# Altium schematic symbol library con-molex.SCHLIB: 368 symbols (part 6 of 6) (continued)
## C-GRID-20-70543 (continued)
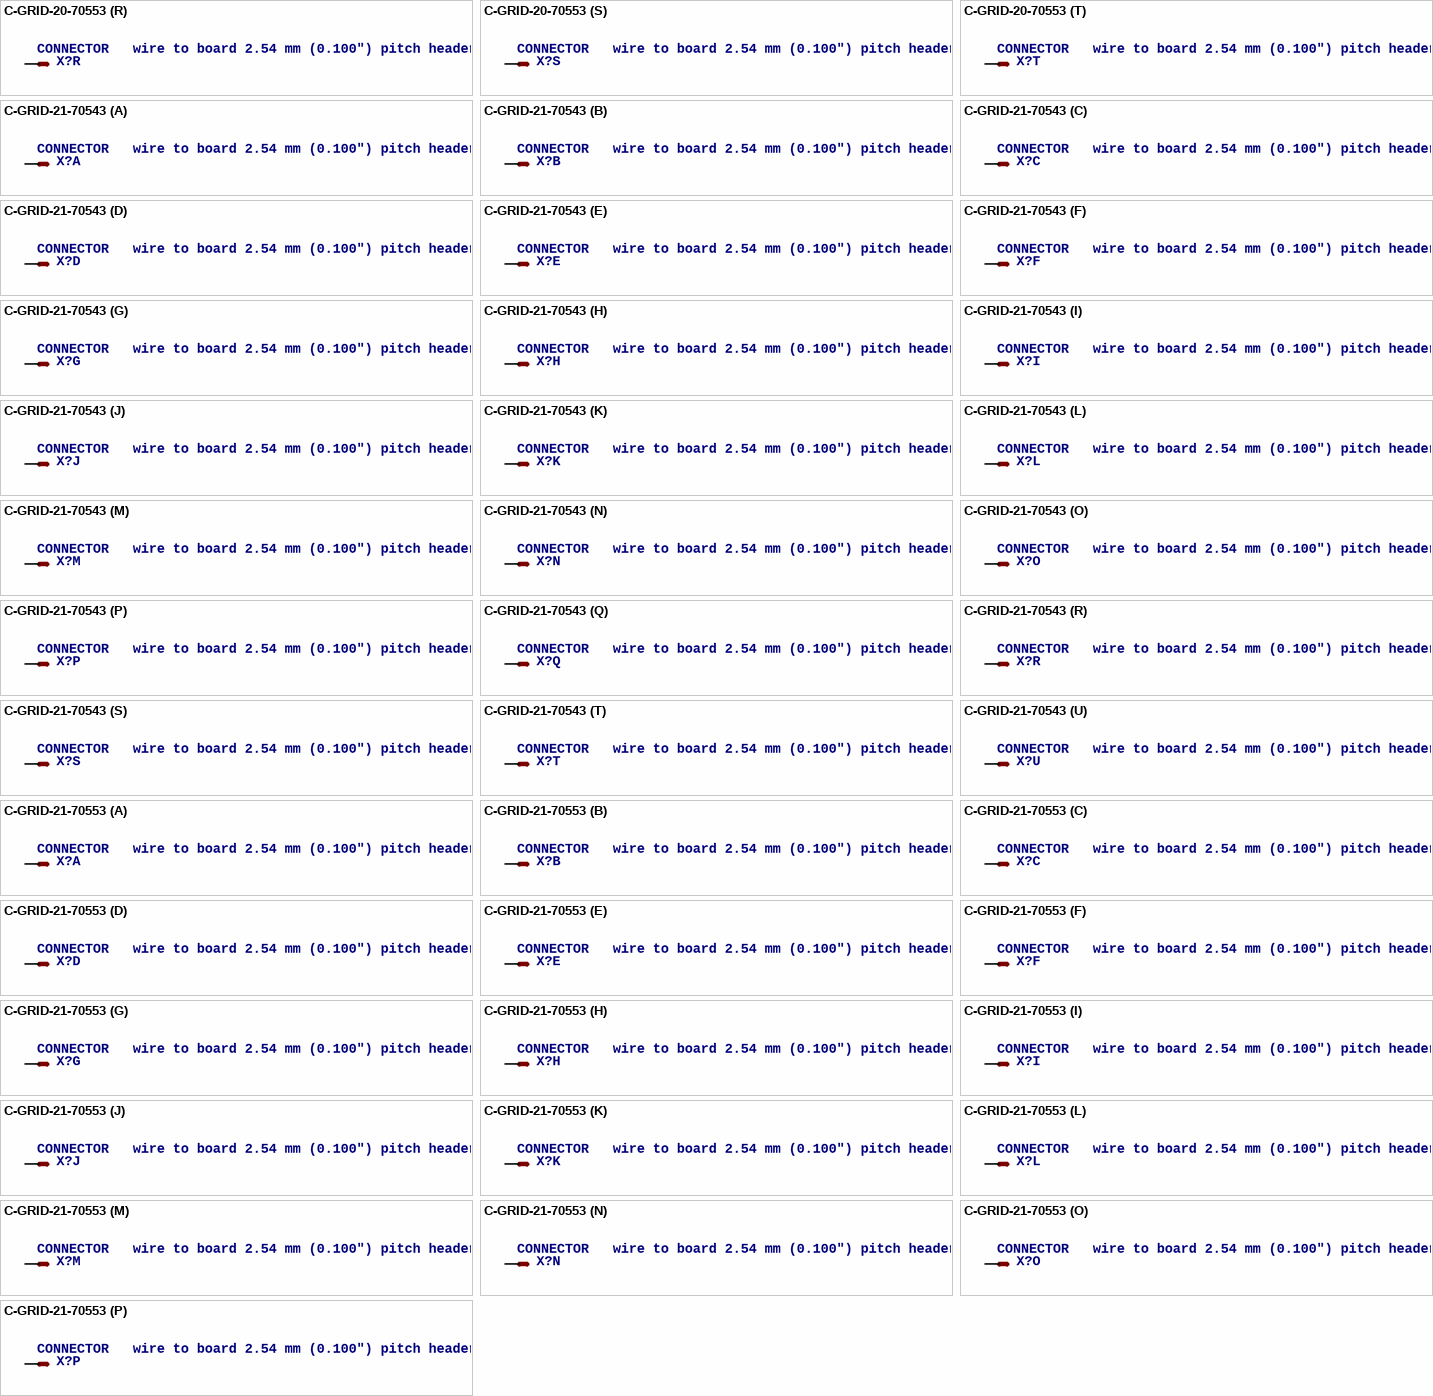
[diagram p123: symbols C-GRID-20-70553 to C-GRID-21-70553]

## C-GRID-20-70553
designator X?, comment CONNECTOR   wire to board 2.54 mm (0.100") pitch header
OC_FARNELL: unknown; OC_NEWARK: unknown
footprint 70553-20
part A pins: 1 S
part B pins: 2 S
part C pins: 3 S
part D pins: 4 S
part E pins: 5 S
part F pins: 6 S
part G pins: 7 S
part H pins: 8 S
part I pins: 9 S
part J pins: 10 S
part K pins: 11 S
part L pins: 12 S
part M pins: 13 S
part N pins: 14 S
part O pins: 15 S
part P pins: 16 S
part Q pins: 17 S
part R pins: 18 S
part S pins: 19 S
part T pins: 20 S

## C-GRID-21-70543
designator X?, comment CONNECTOR   wire to board 2.54 mm (0.100") pitch header
OC_FARNELL: unknown; OC_NEWARK: unknown
footprint 70543-21
part A pins: 1 S
part B pins: 2 S
part C pins: 3 S
part D pins: 4 S
part E pins: 5 S
part F pins: 6 S
part G pins: 7 S
part H pins: 8 S
part I pins: 9 S
part J pins: 10 S
part K pins: 11 S
part L pins: 12 S
part M pins: 13 S
part N pins: 14 S
part O pins: 15 S
part P pins: 16 S
part Q pins: 17 S
part R pins: 18 S
part S pins: 19 S
part T pins: 20 S
part U pins: 21 S

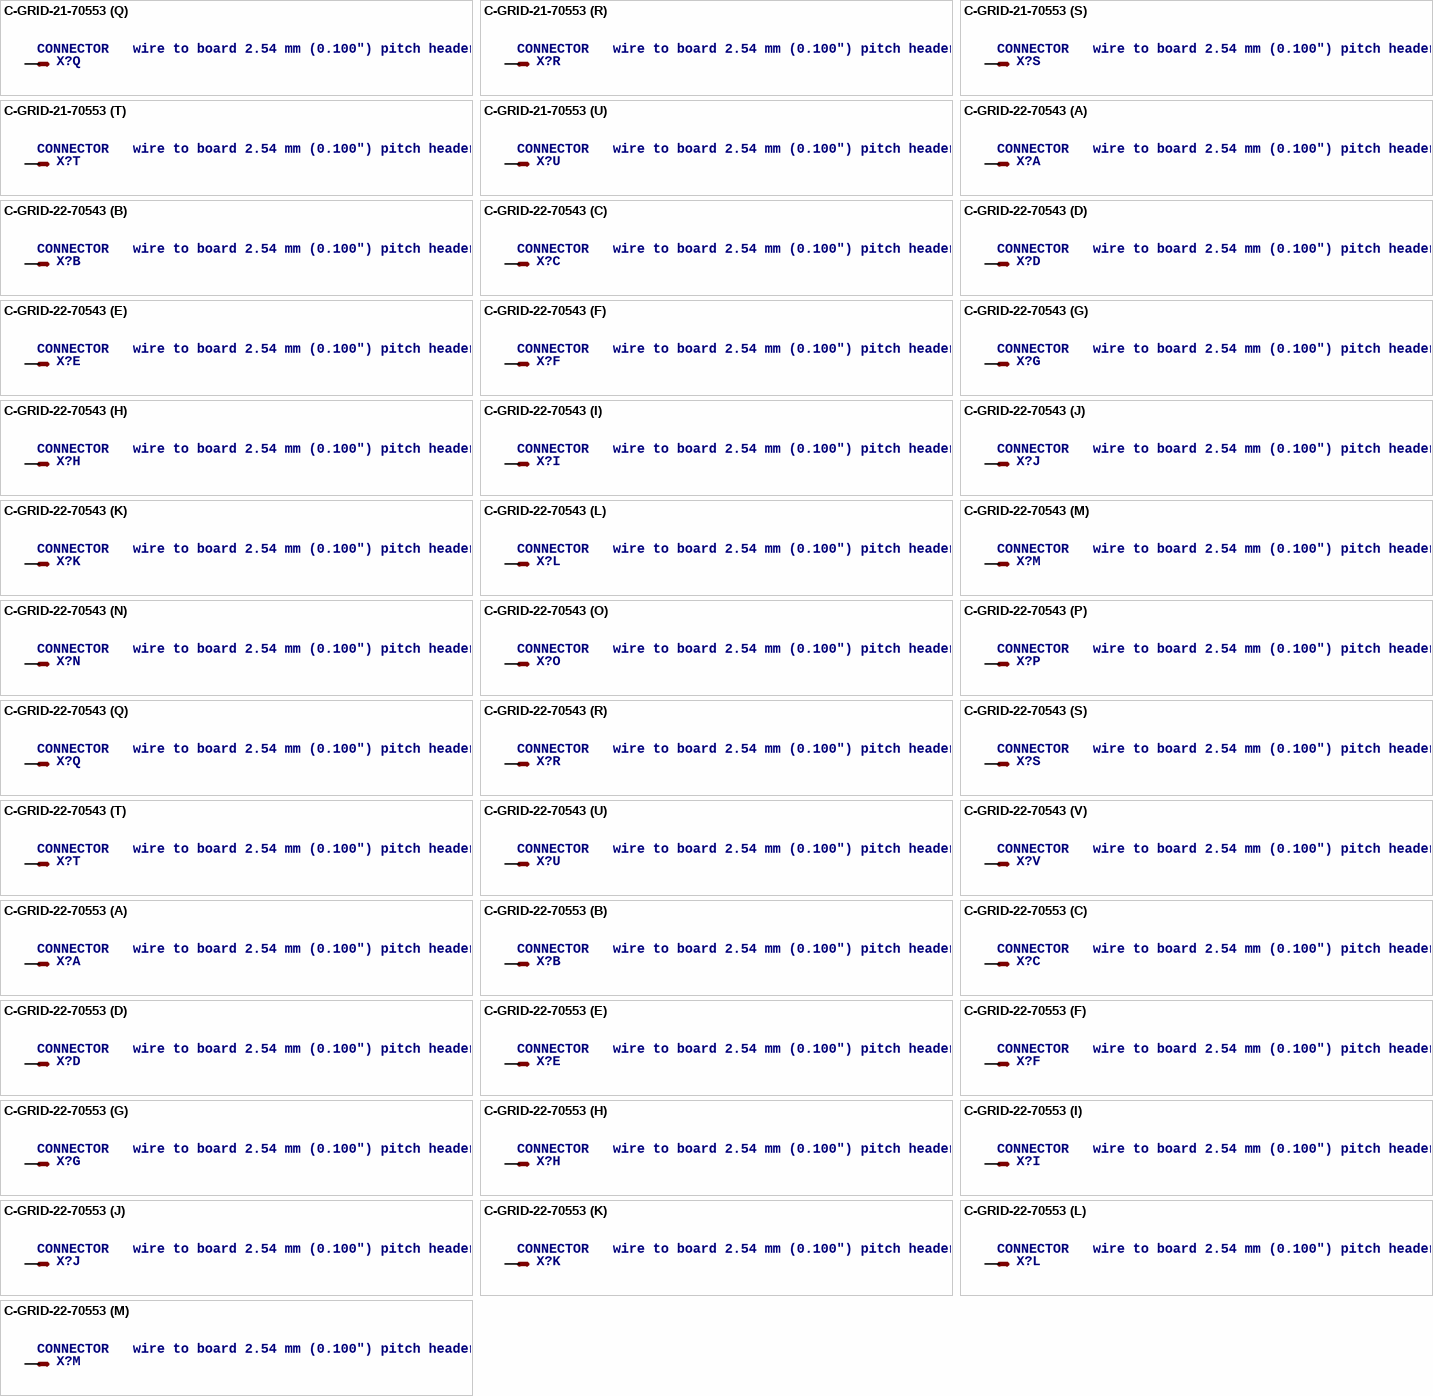
[diagram p124: symbols C-GRID-21-70553 to C-GRID-22-70553]

## C-GRID-21-70553
designator X?, comment CONNECTOR   wire to board 2.54 mm (0.100") pitch header
OC_FARNELL: unknown; OC_NEWARK: unknown
footprint 70553-21
part A pins: 1 S
part B pins: 2 S
part C pins: 3 S
part D pins: 4 S
part E pins: 5 S
part F pins: 6 S
part G pins: 7 S
part H pins: 8 S
part I pins: 9 S
part J pins: 10 S
part K pins: 11 S
part L pins: 12 S
part M pins: 13 S
part N pins: 14 S
part O pins: 15 S
part P pins: 16 S
part Q pins: 17 S
part R pins: 18 S
part S pins: 19 S
part T pins: 20 S
part U pins: 21 S

## C-GRID-22-70543
designator X?, comment CONNECTOR   wire to board 2.54 mm (0.100") pitch header
OC_FARNELL: unknown; OC_NEWARK: unknown
footprint 70543-22
part A pins: 1 S
part B pins: 2 S
part C pins: 3 S
part D pins: 4 S
part E pins: 5 S
part F pins: 6 S
part G pins: 7 S
part H pins: 8 S
part I pins: 9 S
part J pins: 10 S
part K pins: 11 S
part L pins: 12 S
part M pins: 13 S
part N pins: 14 S
part O pins: 15 S
part P pins: 16 S
part Q pins: 17 S
part R pins: 18 S
part S pins: 19 S
part T pins: 20 S
part U pins: 21 S
part V pins: 22 S

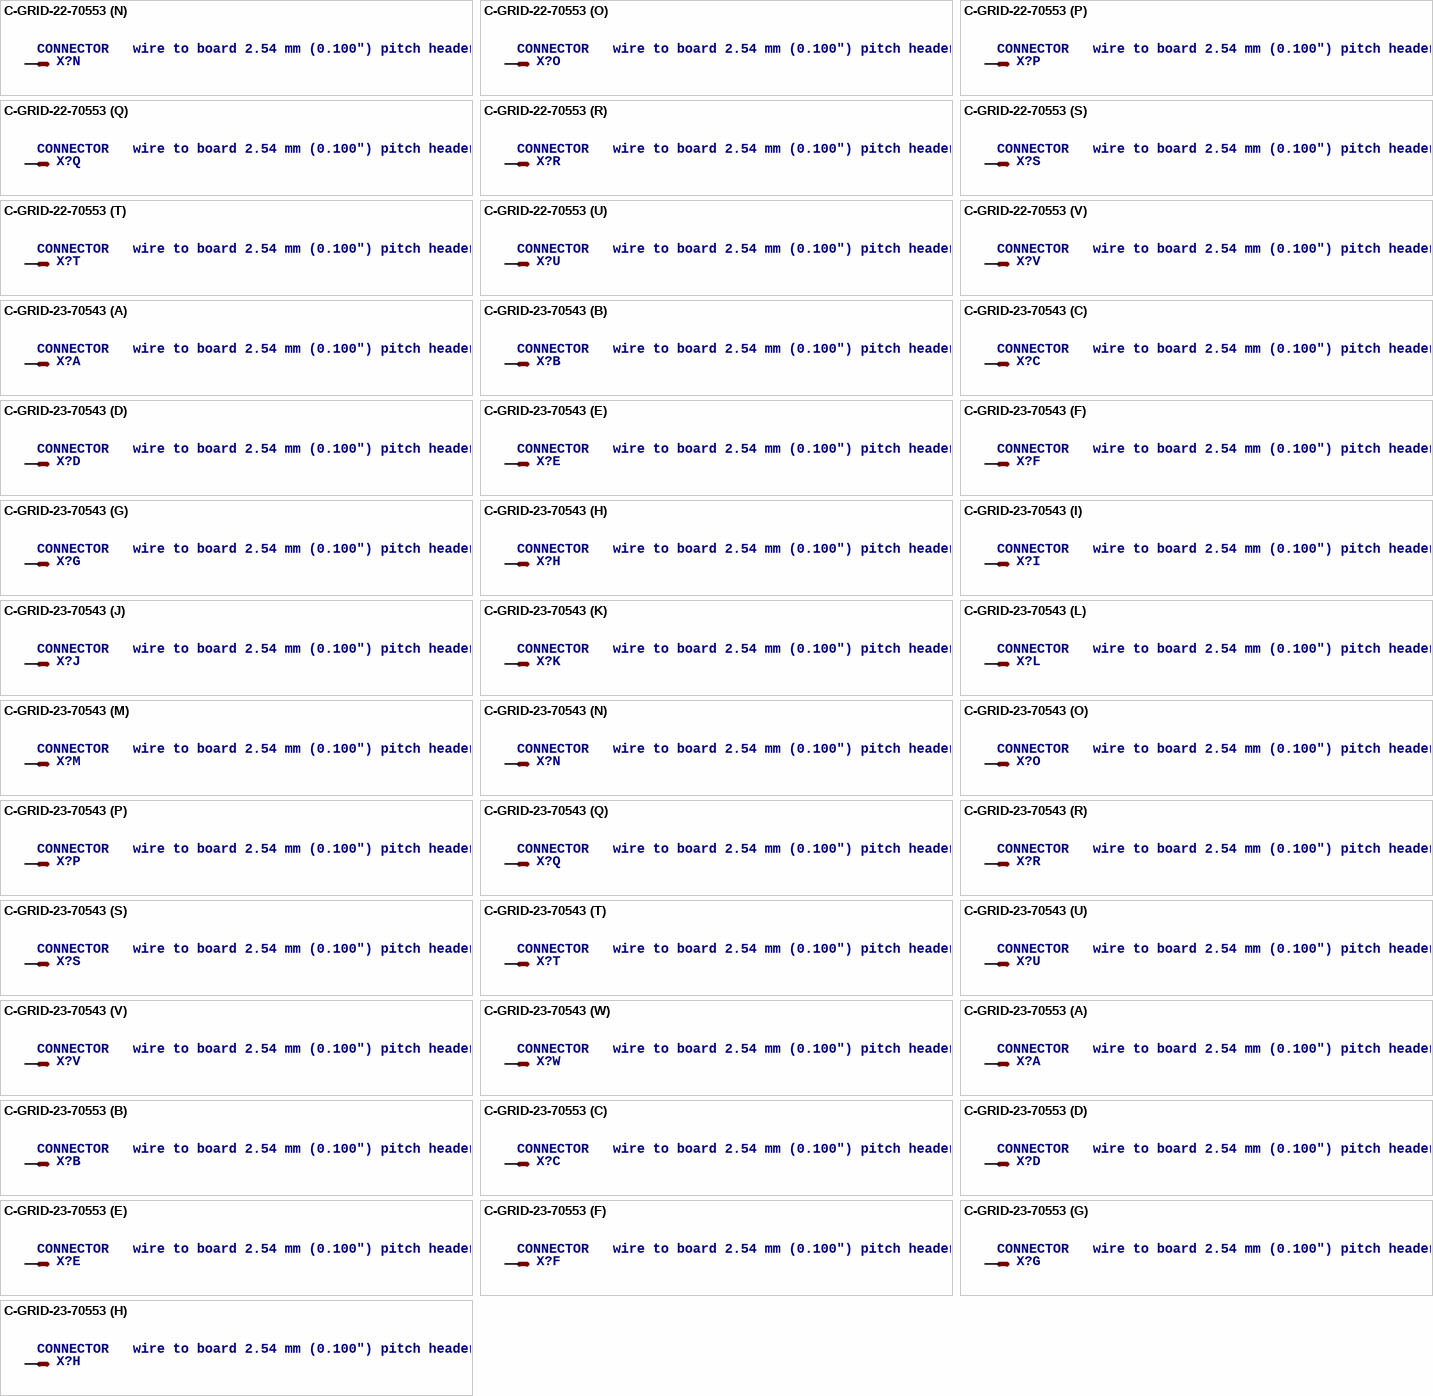
[diagram p125: symbols C-GRID-22-70553 to C-GRID-23-70553]

## C-GRID-22-70553
designator X?, comment CONNECTOR   wire to board 2.54 mm (0.100") pitch header
OC_FARNELL: unknown; OC_NEWARK: unknown
footprint 70553-22
part A pins: 1 S
part B pins: 2 S
part C pins: 3 S
part D pins: 4 S
part E pins: 5 S
part F pins: 6 S
part G pins: 7 S
part H pins: 8 S
part I pins: 9 S
part J pins: 10 S
part K pins: 11 S
part L pins: 12 S
part M pins: 13 S
part N pins: 14 S
part O pins: 15 S
part P pins: 16 S
part Q pins: 17 S
part R pins: 18 S
part S pins: 19 S
part T pins: 20 S
part U pins: 21 S
part V pins: 22 S

## C-GRID-23-70543
designator X?, comment CONNECTOR   wire to board 2.54 mm (0.100") pitch header
OC_FARNELL: unknown; OC_NEWARK: unknown
footprint 70543-23
part A pins: 1 S
part B pins: 2 S
part C pins: 3 S
part D pins: 4 S
part E pins: 5 S
part F pins: 6 S
part G pins: 7 S
part H pins: 8 S
part I pins: 9 S
part J pins: 10 S
part K pins: 11 S
part L pins: 12 S
part M pins: 13 S
part N pins: 14 S
part O pins: 15 S
part P pins: 16 S
part Q pins: 17 S
part R pins: 18 S
part S pins: 19 S
part T pins: 20 S
part U pins: 21 S
part V pins: 22 S
part W pins: 23 S

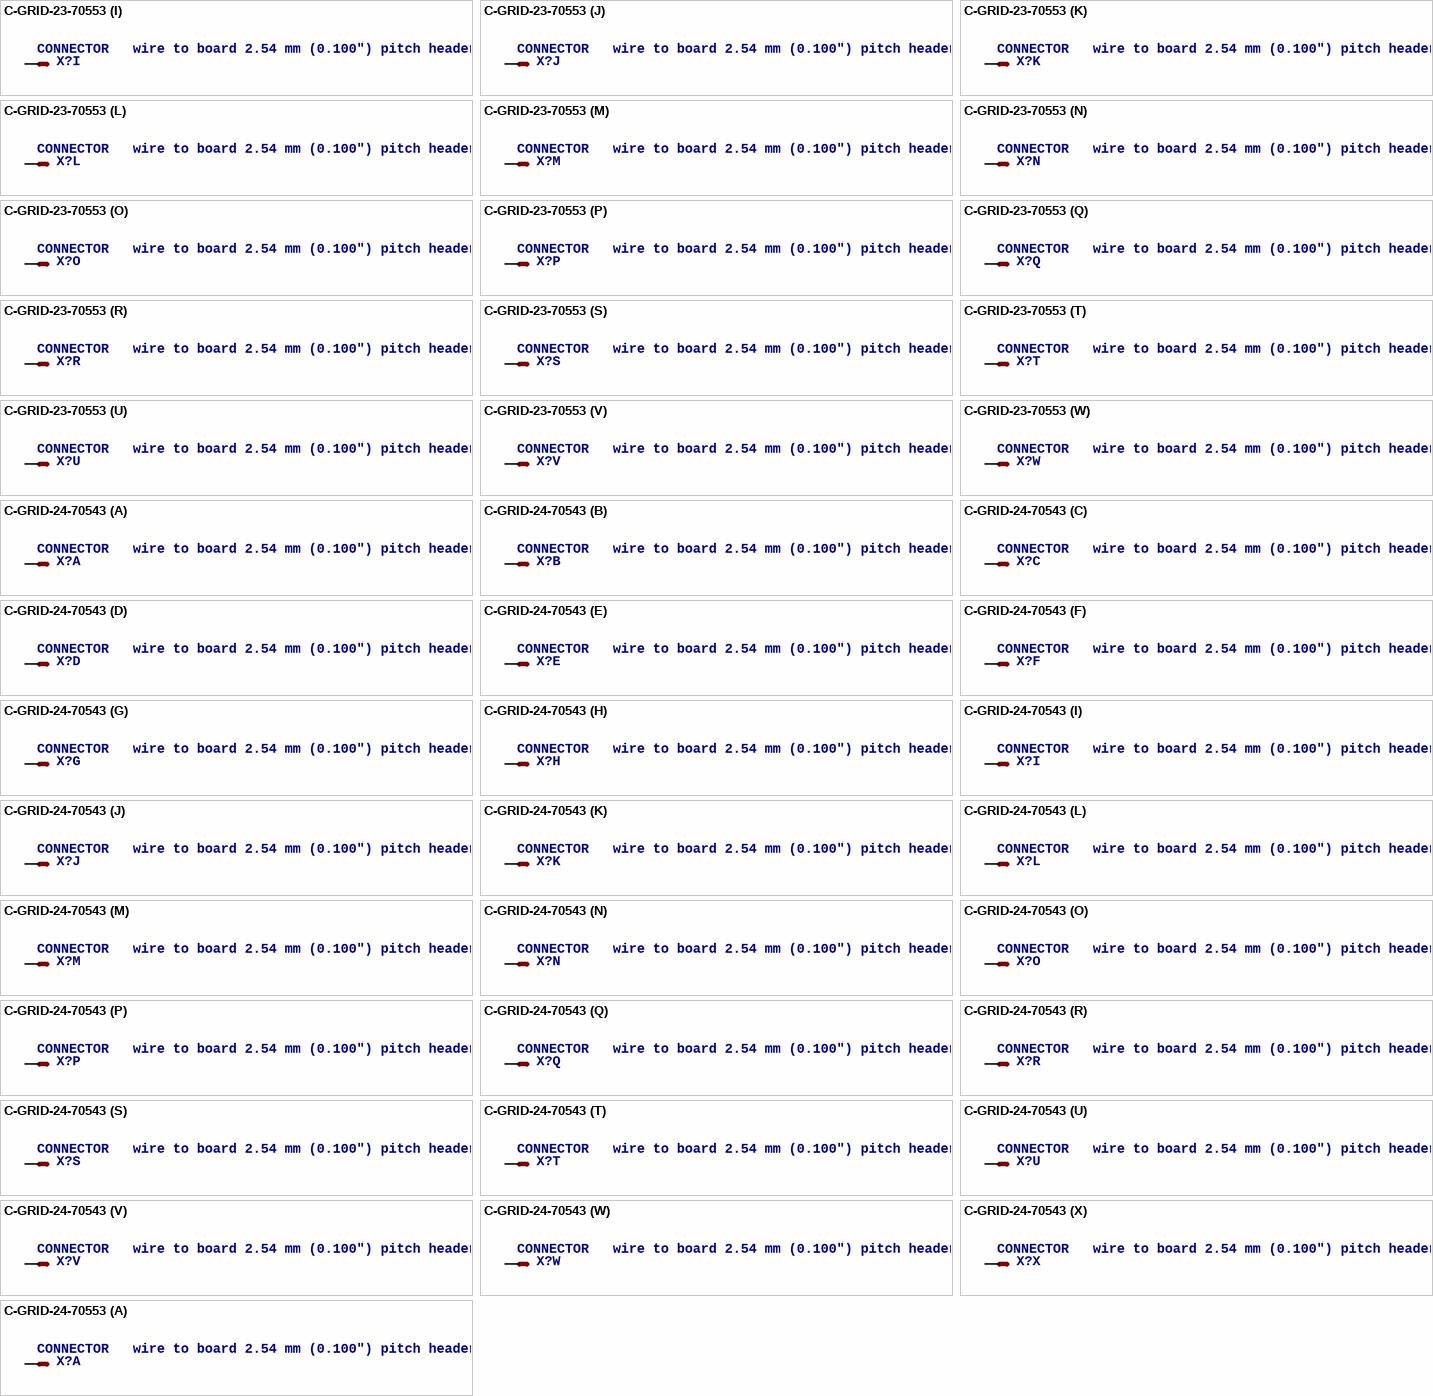
[diagram p126: symbols C-GRID-23-70553 to C-GRID-24-70553]

## C-GRID-23-70553
designator X?, comment CONNECTOR   wire to board 2.54 mm (0.100") pitch header
OC_FARNELL: unknown; OC_NEWARK: unknown
footprint 70553-23
part A pins: 1 S
part B pins: 2 S
part C pins: 3 S
part D pins: 4 S
part E pins: 5 S
part F pins: 6 S
part G pins: 7 S
part H pins: 8 S
part I pins: 9 S
part J pins: 10 S
part K pins: 11 S
part L pins: 12 S
part M pins: 13 S
part N pins: 14 S
part O pins: 15 S
part P pins: 16 S
part Q pins: 17 S
part R pins: 18 S
part S pins: 19 S
part T pins: 20 S
part U pins: 21 S
part V pins: 22 S
part W pins: 23 S

## C-GRID-24-70543
designator X?, comment CONNECTOR   wire to board 2.54 mm (0.100") pitch header
OC_FARNELL: unknown; OC_NEWARK: unknown
footprint 70543-24
part A pins: 1 S
part B pins: 2 S
part C pins: 3 S
part D pins: 4 S
part E pins: 5 S
part F pins: 6 S
part G pins: 7 S
part H pins: 8 S
part I pins: 9 S
part J pins: 10 S
part K pins: 11 S
part L pins: 12 S
part M pins: 13 S
part N pins: 14 S
part O pins: 15 S
part P pins: 16 S
part Q pins: 17 S
part R pins: 18 S
part S pins: 19 S
part T pins: 20 S
part U pins: 21 S
part V pins: 22 S
part W pins: 23 S
part X pins: 24 S
